# Altium footprint library DSP_FPGA_Lib.PcbLib: 30 footprints (part 1 of 2)
Each footprint in its own frame and in the unit in brackets; x right, y up, seen from the top. Pads: shape width x height; smd on the part's side, far side on the other; paste and mask are expansions set on the pad; w line width, h text height; cw(c..) or ccw(c..) is an arc to the next point about the centre after c.
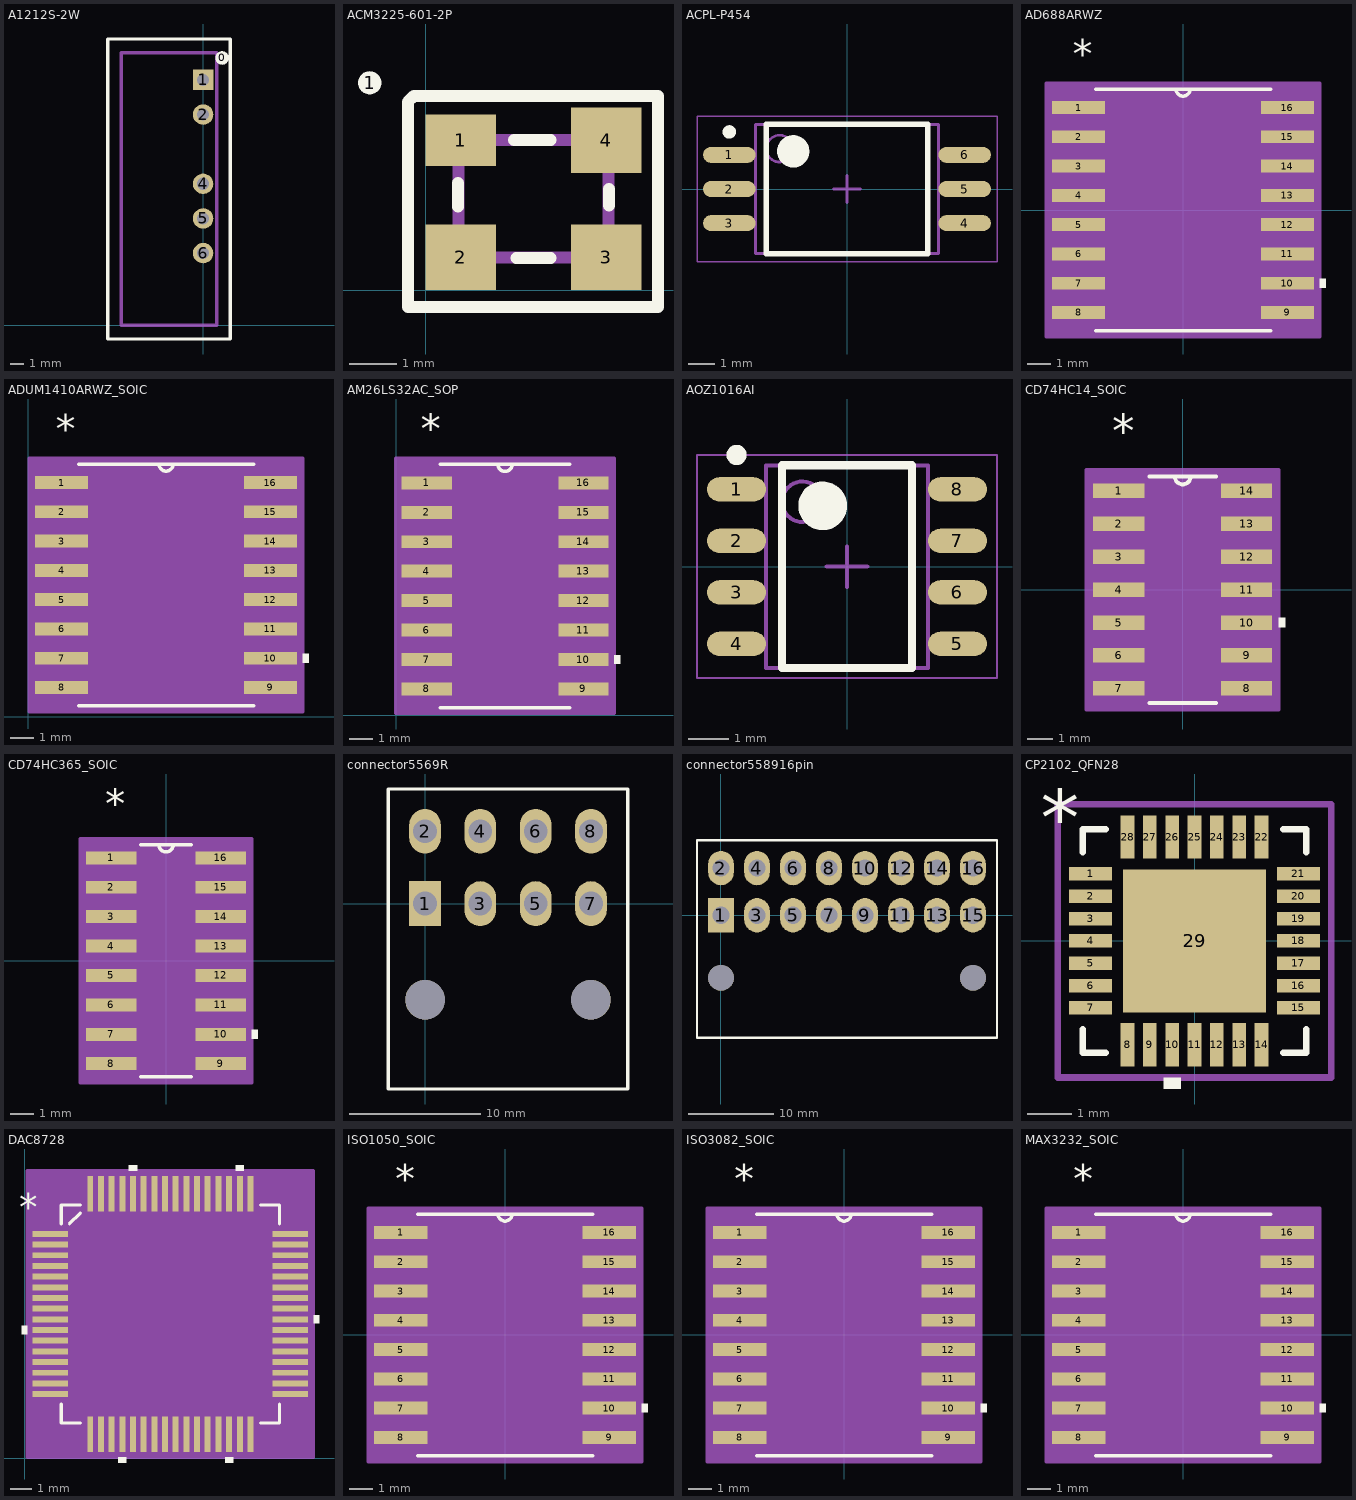
[diagram p0: the footprints below, top view; thin cyan lines are the x and y axes]

## A1212S-2W [mm]
pads (6):
  round 1 on Top Overlay: 0(1.397,19.609)
  rect 1.5x1.5 hole 0.9: 1(0,18)
  round 1.5 hole 0.9: 2(0,15.46) 4(0,10.38) 5(0,7.84) 6(0,5.3)
Top Overlay:
  lines w0.254: -7,-1 2,-1 2,21 -7,21 -7,-1
Mechanical 13:
  lines w0.254: -6,0 -6,20 1,20 1,0 -6,0
3D body: height 11, standoff 0, extent -5.944,0 0.94,19.914

## ACM3225-601-2P [mm] "ACM3225-601-2P"
pads (5):
  round 0.5 on Top Overlay: 1(-1.194,4.42)
  rect 1.5x1.1 smd: 1(0.75,3.2)
  rect 1.5x1.4 smd: 2(0.75,0.7) 3(3.85,0.7) 4(3.85,3.2)
Top Overlay:
  lines w0.254: 0.686,1.778 0.686,2.286 ; 1.88,3.2 2.667,3.2 ; 1.93,0.686 2.667,0.686 ; 3.912,1.803 3.912,2.159 ; -0.381,-0.356 -0.381,4.013 -0.254,4.14 4.953,4.14 4.953,-0.356 -0.381,-0.356
Mechanical 13:
  lines w0.254: 0.7,0.7 3.9,0.7 3.9,3.2 0.7,3.2 0.7,0.7
3D body: height 2.3, standoff 0, extent 0.7,0.7 3.9,3.2

## ACPL-P454 [mm]
height 3.3
pads (6):
  oval 1.95x0.6 smd: 1(-4.375,1.27) 2(-4.375,0) 3(-4.375,-1.27) 4(4.375,-1.27) 5(4.375,0) 6(4.375,1.27)
Top Overlay:
  circle w0.25: c-4.375,2.12 r0.125
  circle w0.6: c-2,1.4 r0.3
  lines w0.2: -3,-2.4 -3,2.4 3,2.4 3,-2.4 -3,-2.4
Mechanical 13:
  circle w0.1: c-2.5,1.5 r0.5
  lines w0.1: -3.4,-2.4 -3.4,2.4 3.4,2.4 3.4,-2.4 -3.4,-2.4
Mechanical 15:
  lines w0.05: -5.575,-2.7 -5.575,2.7 5.575,2.7 5.575,-2.7 -5.575,-2.7
  lines w0.1: -0.5,0 0.5,0 ; 0,-0.5 0,0.5
3D body: height 3.3, standoff 0.3, extent -3.4,-2.4 3.4,2.4

## AD688ARWZ [mil]
pads (16):
  rect 90.5x22 smd: 1(-178.25,175) 2(-178.25,125) 3(-178.25,75) 4(-178.25,25) 5(-178.25,-25) 6(-178.25,-75) 7(-178.25,-125) 8(-178.25,-175) 9(178.25,-175) 10(178.25,-125) 11(178.25,-75) 12(178.25,-25) 13(178.25,25) 14(178.25,75) 15(178.25,125) 16(178.25,175)
Top Overlay:
  region: 233.5,-117.5 243.5,-117.5 243.5,-132.5 233.5,-132.5
  lines w6: -149.5,-206.5 149.5,-206.5 ; -149.5,206.5 149.5,206.5 ; -12,206.5 ccw(c0,206.5) 12,206.5
  text "*" at -188.25,242 h50
Mechanical 13:
  lines w0: -12,206.5 ccw(c0,206.5) 12,206.5
  text "*" at -188.25,242 h50
Mechanical 15:
  region: 233.5,-216.5 -233.5,-216.5 -233.5,216.5 233.5,216.5
  lines w6: -233.5,-216.5 -233.5,216.5 233.5,216.5 233.5,-216.5 -233.5,-216.5
3D body "RW_16.stp": height 104.1, standoff 0, extent -209.5,-206.5 209.5,206.5

## ADUM1410ARWZ_SOIC [mil]
pads (16):
  rect 90.5x22 smd: 1(56.75,400) 2(56.75,350) 3(56.75,300) 4(56.75,250) 5(56.75,200) 6(56.75,150) 7(56.75,100) 8(56.75,50) 9(413.25,50) 10(413.25,100) 11(413.25,150) 12(413.25,200) 13(413.25,250) 14(413.25,300) 15(413.25,350) 16(413.25,400)
Top Overlay:
  region: 468.5,107.5 478.5,107.5 478.5,92.5 468.5,92.5
  lines w6: 85.5,18.5 384.5,18.5 ; 85.5,431.5 384.5,431.5 ; 223,431.5 ccw(c235,431.5) 247,431.5
  text "*" at 46.75,467 h50
Mechanical 13:
  lines w0: 223,431.5 ccw(c235,431.5) 247,431.5
  text "*" at 46.75,467 h50
Mechanical 15:
  region: 468.5,8.5 1.5,8.5 1.5,441.5 468.5,441.5
  lines w6: 1.5,8.5 1.5,441.5 468.5,441.5 468.5,8.5 1.5,8.5
3D body "RW_16.stp": height 104.1, standoff 0, extent 25.5,18.5 444.5,431.5

## AM26LS32AC_SOP [mil]
pads (16):
  rect 85x22 smd: 1(52,395) 2(52,345) 3(52,295) 4(52,245) 5(52,195) 6(52,145) 7(52,95) 8(52,45) 9(318,45) 10(318,95) 11(318,145) 12(318,195) 13(318,245) 14(318,295) 15(318,345) 16(318,395)
Top Overlay:
  region: 370.5,102.5 380.5,102.5 380.5,87.5 370.5,87.5
  lines w6: 75,13.5 295,13.5 ; 75,426.5 295,426.5 ; 173,426.5 ccw(c185,426.5) 197,426.5
  text "*" at 42,462 h50
Mechanical 13:
  lines w0: 173,426.5 ccw(c185,426.5) 197,426.5
  text "*" at 42,462 h50
Mechanical 15:
  region: 370.5,3.5 -0.5,3.5 -0.5,436.5 370.5,436.5
  lines w6: -0.5,3.5 -0.5,436.5 370.5,436.5 370.5,3.5 -0.5,3.5
3D body "NS16.stp": height 79.1, standoff 0, extent 23.5,13.5 346.5,426.5

## AOZ1016AI [mm]
height 1.75
pads (8):
  oval 1.45x0.6 smd: 1(-2.725,1.905) 2(-2.725,0.635) 3(-2.725,-0.635) 4(-2.725,-1.905) 5(2.725,-1.905) 6(2.725,-0.635) 7(2.725,0.635) 8(2.725,1.905)
Top Overlay:
  circle w0.6: c-0.6,1.5 r0.3
  circle w0.25: c-2.725,2.755 r0.125
  lines w0.2: -1.6,-2.5 1.6,-2.5 1.6,2.5 -1.6,2.5 -1.6,-2.5
Mechanical 13:
  circle w0.1: c-1.1,1.6 r0.5
  lines w0.1: -2,-2.5 2,-2.5 2,2.5 -2,2.5 -2,-2.5
Mechanical 15:
  lines w0.05: -3.7,-2.75 3.7,-2.75 3.7,2.75 -3.7,2.75 -3.7,-2.75
  lines w0.1: -0.5,0 0.5,0 ; 0,-0.5 0,0.5
3D body: height 1.75, standoff 0.1, extent -2,-2.5 2,2.5

## CD74HC14_SOIC [mil]
pads (14):
  rect 78x22 smd: 1(-97,150) 2(-97,100) 3(-97,50) 4(-97,0) 5(-97,-50) 6(-97,-100) 7(-97,-150) 8(97,-150) 9(97,-100) 10(97,-50) 11(97,0) 12(97,50) 13(97,100) 14(97,150)
Top Overlay:
  region: 146,-42.5 156,-42.5 156,-57.5 146,-57.5
  lines w6: -50.89,-172 50.89,-172 ; -50.89,172 50.89,172 ; -12,172 ccw(c0,172) 12,172
  text "*" at -107,217 h50
Mechanical 13:
  lines w0: -12,172 ccw(c0,172) 12,172
  text "*" at -107,217 h50
Mechanical 15:
  region: 146,-182 -146,-182 -146,182 146,182
  lines w6: -146,-182 146,-182 146,182 -146,182 -146,-182
3D body "D14.stp": height 69.1, standoff 0, extent -122,-172 122,172

## CD74HC365_SOIC [mil]
pads (16):
  rect 86x22 smd: 1(-93,175) 2(-93,125) 3(-93,75) 4(-93,25) 5(-93,-25) 6(-93,-75) 7(-93,-125) 8(-93,-175) 9(93,-175) 10(93,-125) 11(93,-75) 12(93,-25) 13(93,25) 14(93,75) 15(93,125) 16(93,175)
Top Overlay:
  region: 146,-117.5 156,-117.5 156,-132.5 146,-132.5
  lines w6: -42.89,-197 42.89,-197 ; -42.89,197 42.89,197 ; -12,197 ccw(c0,197) 12,197
  text "*" at -103,242 h50
Mechanical 13:
  lines w0: -12,197 ccw(c0,197) 12,197
  text "*" at -103,242 h50
Mechanical 15:
  region: 146,-207 -146,-207 -146,207 146,207
  lines w6: -146,-207 146,-207 146,207 -146,207 -146,-207
3D body "D16.stp": height 69.1, standoff 0, extent -122,-197 122,197

## connector5569R [mm]
pads (10):
  rect 2.4x3.4 hole 1.8: 1(0,0)
  oval 2.4x3.4 hole 1.8: 2(0,5.5) 3(4.2,0) 4(4.2,5.5) 5(8.4,0) 6(8.4,5.5) 7(12.6,0) 8(12.6,5.5)
  round 3 hole 3 unplated: ""(0,-7.3) ""(12.6,-7.3)
Top Overlay:
  lines w0.254: -2.8,-14.075 15.4,-14.075 15.4,8.7 -2.8,8.7 -2.8,-14.075
3D body "26013144.stp": height 11.4, standoff -3.6, extent -2.823,-13.843 15.577,6.092
3D body: height 0.25, standoff -19.93, extent 6.395,2.719 6.395,2.719

## connector558916pin [mm]
pads (18):
  rect 3x4 hole 2: 1(0,0)
  oval 3x4 hole 2: 2(0,5.5) 3(4.2,0) 4(4.2,5.5) 5(8.4,0) 6(8.4,5.5) 7(12.6,0) 8(12.6,5.5) 9(16.8,0) 10(16.8,5.5) 11(21,0) 12(21,5.5) 13(25.2,0) 14(25.2,5.5) 15(29.4,0) 16(29.4,5.5)
  round 3 hole 3 unplated: ""(0,-7.3) ""(29.4,-7.3)
Top Overlay:
  lines w0.254: -2.8,-14.287 32.2,-14.287 32.2,8.75 -2.8,8.75 -2.8,-14.287
3D body "39300160.stp": height 11.4, standoff -3.6, extent -2.8,-13.885 32.4,6.05

## CP2102_QFN28 [mil]
pads (29):
  rect 38x12 smd mask+5: 1(-91.5,59.06) 2(-91.5,39.37) 3(-91.5,19.68) 4(-91.5,0) 5(-91.5,-19.68) 6(-91.5,-39.37) 7(-91.5,-59.06) 15(91.5,-59.06) 16(91.5,-39.37) 17(91.5,-19.68) 18(91.5,0) 19(91.5,19.68) 20(91.5,39.37) 21(91.5,59.06)
  rect 12x38 smd mask+5: 8(-59.06,-91.5) 9(-39.37,-91.5) 10(-19.68,-91.5) 11(0,-91.5) 12(19.68,-91.5) 13(39.37,-91.5) 14(59.06,-91.5) 22(59.06,91.5) 23(39.37,91.5) 24(19.68,91.5) 25(0,91.5) 26(-19.68,91.5) 27(-39.37,91.5) 28(-59.06,91.5)
  rect 125.98x125.98 smd mask-65.5: 29(0,0)
Top Overlay:
  region: -12.19,-120.5 -27.18,-120.5 -27.18,-130.5 -12.19,-130.5
  lines w6: -98.5,-78.16 -98.5,-98.5 -78.16,-98.5 ; -98.5,78.16 -98.5,98.5 -78.16,98.5 ; 78.16,-98.5 98.5,-98.5 98.5,-78.16 ; 78.16,98.5 98.5,98.5 98.5,78.16
  text "*" at -135.5,83.9 h50
Mechanical 13:
  text "*" at -135.5,83.9 h50
Mechanical 15:
  lines w6: -120.5,-120.5 -120.5,120.5 120.5,120.5 120.5,-120.5 -120.5,-120.5
3D body "QFN28N5X5-0p5P.stp": height 37.1, standoff 0, extent -100.5,-100.5 100.5,100.5

## DAC8728 [mil]
pads (64):
  rect 65.5x11 smd: 1(46.75,413.64) 2(46.75,393.95) 3(46.75,374.27) 4(46.75,354.58) 5(46.75,334.9) 6(46.75,315.21) 7(46.75,295.53) 8(46.75,275.84) 9(46.75,256.16) 10(46.75,236.47) 11(46.75,216.79) 12(46.75,197.1) 13(46.75,177.42) 14(46.75,157.73) 15(46.75,138.05) 16(46.75,118.36) 33(489.25,118.36) 34(489.25,138.05) 35(489.25,157.73) 36(489.25,177.42) 37(489.25,197.1) 38(489.25,216.79) 39(489.25,236.47) 40(489.25,256.16) 41(489.25,275.84) 42(489.25,295.53) 43(489.25,315.21) 44(489.25,334.9) 45(489.25,354.58) 46(489.25,374.27) 47(489.25,393.95) 48(489.25,413.64)
  rect 11x65.5 smd: 17(120.36,44.75) 18(140.05,44.75) 19(159.73,44.75) 20(179.42,44.75) 21(199.1,44.75) 22(218.79,44.75) 23(238.47,44.75) 24(258.16,44.75) 25(277.84,44.75) 26(297.53,44.75) 27(317.21,44.75) 28(336.9,44.75) 29(356.58,44.75) 30(376.27,44.75) 31(395.95,44.75) 32(415.64,44.75) 49(415.64,487.25) 50(395.95,487.25) 51(376.27,487.25) 52(356.58,487.25) 53(336.9,487.25) 54(317.21,487.25) 55(297.53,487.25) 56(277.84,487.25) 57(258.16,487.25) 58(238.47,487.25) 59(218.79,487.25) 60(199.1,487.25) 61(179.42,487.25) 62(159.73,487.25) 63(140.05,487.25) 64(120.36,487.25)
Top Overlay:
  region: 206.6,530 191.6,530 191.6,540 206.6,540
  region: 403.45,530 388.45,530 388.45,540 403.45,540
  region: 532,263.66 542,263.66 542,248.66 532,248.66
  region: 383.77,2 368.77,2 368.77,-8 383.77,-8
  region: 186.92,2 171.92,2 171.92,-8 186.92,-8
  region: 4,243.97 -6,243.97 -6,228.97 4,228.97
  lines w6: 67,99.76 67,65 101.76,65 ; 67,432.24 67,467 101.76,467 ; 82,432 102,452 ; 434.24,65 469,65 469,99.76 ; 434.24,467 469,467 469,432.24
  text "*" at -11,438.48 h50
Mechanical 13:
  text "*" at -11,438.48 h50
Mechanical 15:
  region: 532,2 4,2 4,530 532,530
  lines w6: 4,2 532,2 532,530 4,530 4,2
3D body "PAG64.stp": height 47.1, standoff 0, extent 28,26 508,506

## ISO1050_SOIC [mil]
pads (16):
  rect 91x22 smd: 1(-178,175) 2(-178,125) 3(-178,75) 4(-178,25) 5(-178,-25) 6(-178,-75) 7(-178,-125) 8(-178,-175) 9(178,-175) 10(178,-125) 11(178,-75) 12(178,-25) 13(178,25) 14(178,75) 15(178,125) 16(178,175)
Top Overlay:
  region: 233.5,-117.5 243.5,-117.5 243.5,-132.5 233.5,-132.5
  lines w6: -149.5,-206.5 149.5,-206.5 ; -149.5,206.5 149.5,206.5 ; -12,206.5 ccw(c0,206.5) 12,206.5
  text "*" at -188,242 h50
Mechanical 13:
  lines w0: -12,206.5 ccw(c0,206.5) 12,206.5
  text "*" at -188,242 h50
Mechanical 15:
  region: 233.5,-216.5 -233.5,-216.5 -233.5,216.5 233.5,216.5
  lines w6: -233.5,-216.5 -233.5,216.5 233.5,216.5 233.5,-216.5 -233.5,-216.5
3D body "DW16.stp": height 104.1, standoff 0, extent -209.5,-206.5 209.5,206.5

## ISO3082_SOIC [mil]
pads (16):
  rect 91x22 smd: 1(-178,175) 2(-178,125) 3(-178,75) 4(-178,25) 5(-178,-25) 6(-178,-75) 7(-178,-125) 8(-178,-175) 9(178,-175) 10(178,-125) 11(178,-75) 12(178,-25) 13(178,25) 14(178,75) 15(178,125) 16(178,175)
Top Overlay:
  region: 233.5,-117.5 243.5,-117.5 243.5,-132.5 233.5,-132.5
  lines w6: -149.5,-206.5 149.5,-206.5 ; -149.5,206.5 149.5,206.5 ; -12,206.5 ccw(c0,206.5) 12,206.5
  text "*" at -188,242 h50
Mechanical 13:
  lines w0: -12,206.5 ccw(c0,206.5) 12,206.5
  text "*" at -188,242 h50
Mechanical 15:
  region: 233.5,-216.5 -233.5,-216.5 -233.5,216.5 233.5,216.5
  lines w6: -233.5,-216.5 233.5,-216.5 233.5,216.5 -233.5,216.5 -233.5,-216.5
3D body "DW16.stp": height 104.1, standoff 0, extent -209.5,-206.5 209.5,206.5

## MAX3232_SOIC [mil]
pads (16):
  rect 91x22 smd: 1(-178,175) 2(-178,125) 3(-178,75) 4(-178,25) 5(-178,-25) 6(-178,-75) 7(-178,-125) 8(-178,-175) 9(178,-175) 10(178,-125) 11(178,-75) 12(178,-25) 13(178,25) 14(178,75) 15(178,125) 16(178,175)
Top Overlay:
  region: 233.5,-117.5 243.5,-117.5 243.5,-132.5 233.5,-132.5
  lines w6: -149.5,-206.5 149.5,-206.5 ; -149.5,206.5 149.5,206.5 ; -12,206.5 ccw(c0,206.5) 12,206.5
  text "*" at -188,242 h50
Mechanical 13:
  lines w0: -12,206.5 ccw(c0,206.5) 12,206.5
  text "*" at -188,242 h50
Mechanical 15:
  region: 233.5,-216.5 -233.5,-216.5 -233.5,216.5 233.5,216.5
  lines w6: -233.5,-216.5 -233.5,216.5 233.5,216.5 233.5,-216.5 -233.5,-216.5
3D body "DW16.stp": height 104.1, standoff 0, extent -209.5,-206.5 209.5,206.5